# Altium integrated library BS_Altium_Lib.IntLib: 1016 symbols (part 1 of 8) (continued)
## DFLR1600-7 (continued)
DIODE GEN 600V 1A POWERDI123; Manufacturer: Diodes Incorporated; Diode Type: Standard; Voltage - Forward (Vf) (Max) @ If: 1.1V @ 1A; Speed: Standard Recovery >500ns, > 200mA (Io); Current - Reverse Leakage @ Vr: 3µA @ 600V; Capacitance @ Vr, F: 10pF @ 4V, 1MHz; Configuration: Single; Type: Standard Recovery Rectifiers; Max Surge Current: 25 A; Ir - Reverse Current: 3 uA; Vf - Forward Voltage: 1.1 V; Supplier 1: Digi-Key; Manufacturer Part Number: DFLR1600-7; RoHS: RoHS Compliant; Category: Discrete Semiconductor Products; Stock 1: 5690; Pricing 1: 1=0.46, 10=0.346, 100=0.2153, 500=0.1473, 1000=0.1133 (USD); Packaging: Cut Tape (CT); Part Status: Active; Voltage - DC Reverse (Vr) (Max): 600V; Current - Average Rectified (Io): 1A; Reverse Recovery Time (trr): -; Mounting Type: Surface Mount; Package / Case: POWERDI®123; Supplier Device Package: PowerDI™ 123; Operating Temperature - Junction: -65°C ~ 150°C; ComponentLink1URL: http://www.diodes.com/_files/datasheets/ds30602.pdf; ComponentLink1Description: http://www.diodes.com/_files/datasheets/ds30602.pdf; Supplier 2: Mouser; Stock 2: 4390; Pricing 2: 1=0.440, 10=0.312, 100=0.143, 1000=0.110, 3000=0.094, 9000=0.085, 24000=0.079, 45000=0.071, 99000=0.067 (USD); Height: 0.98 mm; Length: 2.8 mm; Operating Temperature Range: - 65 C to + 150 C; Product: Rectifiers; Series: DFLR1600; Width: 1.78 mm; Brand: Diodes Incorporated; Mounting Style: SMD/SMT; Recovery Time: -; If - Forward Current: 1 A; Maximum Operating Temperature: + 150 C; Minimum Operating Temperature: - 65 C; Pd - Power Dissipation: -; Standard Pack Qty: 3000; Vr - Reverse Voltage: 600 V; RoHS - Mouser: Y; Minimum Order Quantity: 1; Reeling: True; ComponentLink2URL: http://www.mouser.com/ds/2/115/ds30602-89344.pdf; ComponentLink2Description: http://www.mouser.com/ds/2/115/ds30602-89344.pdf; Supplier Part Number 1: DFLR1600-7DICT-ND; Supplier Part Number 2: 621-DFLR1600-7
footprint SOD PowerDI123
pins: 1 A, 2 K


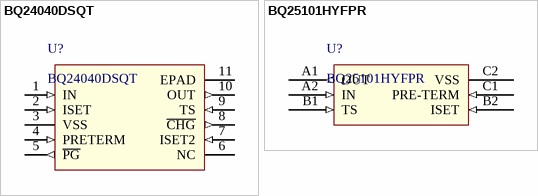
[diagram p7: symbols BQ24040DSQT to BQ25101HYFPR]

## BQ24040DSQT
designator U?
IC BATT CHG LI-ION 1 CELL 10SON; Manufacturer: Texas Instruments; Battery Chemistry: Lithium-Ion/Polymer; Number of Cells: 1; Current - Charging: Constant - Programmable; Programmable Features: Current; Fault Protection: Over Temperature, Over Voltage, Short Circuit; Charge Current - Max: 1A; Battery Pack Voltage: 4.2V; Voltage - Supply (Max): 28V; Supplier 1: Digi-Key; Supplier Part Number 1: 296-25136-1-ND; Manufacturer Part Number: BQ24040DSQT; RoHS: RoHS Compliant; Category: Integrated Circuits (ICs); Stock 1: 2838; Pricing 1: 1=1.48, 10=1.322, 100=1.0305 (USD); Packaging: Cut Tape (CT); Part Status: Active; Interface: -; Operating Temperature: -40°C ~ 85°C (TA); Supplier Device Package: 10-SON (2x2); ComponentLink1URL: http://www.ti.com/lit/ds/symlink/bq24040.pdf; ComponentLink1Description: http://www.ti.com/lit/ds/symlink/bq24040.pdf; Package: 10-WFDFN Exposed Pad
footprint WFDFN-10 Exposed Pad
pins: 1 IN (in), 2 ISET (in), 3 VSS (power), 4 PRETERM (in), 5 ~{PG} (out), 6 NC, 7 ISET2 (in), 8 ~{CHG} (out), 9 TS (in), 10 OUT (out), 11 EPAD (power)

## BQ25101HYFPR
designator U?
IC LI-ION CHARGE MGMT; Manufacturer: Texas Instruments; Battery Chemistry: Lithium-Ion/Polymer; Number of Cells: 1; Current - Charging: Constant - Programmable; Programmable Features: Current; Fault Protection: Over Temperature, Over Voltage, Short Circuit; Charge Current - Max: 250mA; Battery Pack Voltage: 4.35V; Voltage - Supply (Max): 6.45V; Supplier 1: Digi-Key; Supplier Part Number 1: 296-39932-1-ND; Manufacturer Part Number: BQ25101HYFPR; RoHS: RoHS Compliant; Category: Integrated Circuits (ICs); Stock 1: 6025; Pricing 1: 1=2.05, 10=1.842, 100=1.4809, 500=1.21668, 1000=1.00811 (USD); Packaging: Cut Tape (CT); Part Status: Active; Interface: -; Operating Temperature: 0°C ~ 125°C (TJ); Supplier Device Package: 6-DSBGA; ComponentLink1URL: http://www.ti.com/lit/ds/symlink/bq25101h.pdf; ComponentLink1Description: http://www.ti.com/lit/ds/symlink/bq25101h.pdf; Package: 6-XFBGA, DSBGA
footprint YFP6
pins: A1 OUT (out), A2 IN (in), B1 TS (in), B2 ISET (in), C1 PRE-TERM (in), C2 VSS (power)


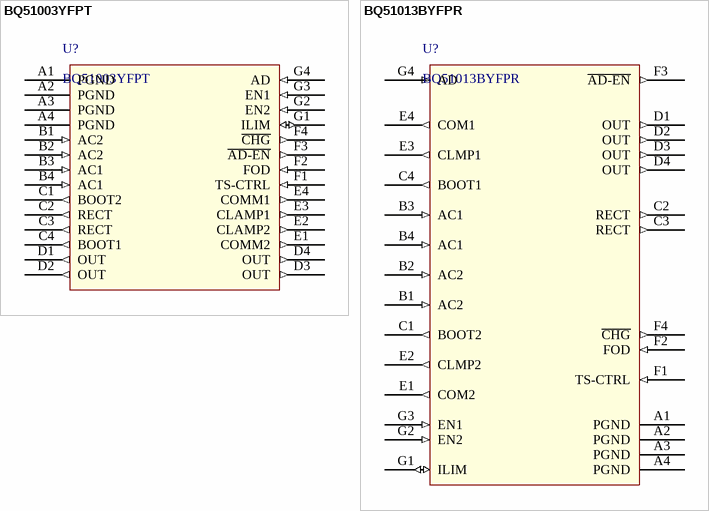
[diagram p8: symbols BQ51003YFPT to BQ51013BYFPR]

## BQ51003YFPT
designator U?
IC WIRELESS PWR RCVR 28DSBGA; Manufacturer: Texas Instruments; Current - Supply: 500mA; Voltage - Supply: 4 V ~ 10 V; Supplier 1: Digi-Key; Supplier Part Number 1: 296-37245-1-ND; Manufacturer Part Number: BQ51003YFPT; RoHS: RoHS Compliant; Category: Integrated Circuits (ICs); Stock 1: 1012; Pricing 1: 1=3.35, 10=2.99, 25=2.6908, 100=2.4517 (USD); Packaging: Cut Tape (CT); Part Status: Active; Applications: Wireless Power Receiver; Operating Temperature: -40°C ~ 85°C; Mounting Type: Surface Mount; Supplier Device Package: 28-DSBGA; ComponentLink1URL: http://www.ti.com/lit/ds/symlink/bq51003.pdf; ComponentLink1Description: http://www.ti.com/lit/ds/symlink/bq51003.pdf; Package: 28-XFBGA, DSBGA
footprint YFP28
pins: A1 PGND (power), A2 PGND (power), A3 PGND (power), A4 PGND (power), B1 AC2 (in), B2 AC2 (in), B3 AC1 (in), B4 AC1 (in), C1 BOOT2 (out), C2 RECT (out), C3 RECT (out), C4 BOOT1 (out), D1 OUT (out), D2 OUT (out), D3 OUT (out), D4 OUT (out), E1 COMM2 (out), E2 CLAMP2 (out), E3 CLAMP1 (out), E4 COMM1 (out), F1 TS-CTRL (in), F2 FOD (in), F3 ~{AD-EN} (out), F4 ~{CHG} (out), G1 ILIM (io), G2 EN2 (in), G3 EN1 (in), G4 AD (in)

## BQ51013BYFPR
designator U?
IC WIRELESS PWR RCVR 28DSBGA; Manufacturer: Texas Instruments; Current - Supply: 8mA; Voltage - Supply: 4 V ~ 10 V; Supplier 1: Digi-Key; Supplier Part Number 1: 296-39955-1-ND; Manufacturer Part Number: BQ51013BYFPR; RoHS: RoHS Compliant; Category: Integrated Circuits (ICs); Stock 1: 3099; Pricing 1: 1=3.32, 10=2.978, 100=2.4403, 500=2.0774, 1000=1.75203 (USD); Packaging: Cut Tape (CT); Part Status: Active; Applications: Wireless Power Receiver; Operating Temperature: 0°C ~ 125°C; Mounting Type: Surface Mount; Supplier Device Package: 28-DSBGA; ComponentLink1URL: http://www.ti.com/lit/ds/symlink/bq51013b.pdf; ComponentLink1Description: http://www.ti.com/lit/ds/symlink/bq51013b.pdf; Package: 28-XFBGA, DSBGA
footprint YFP28
pins: A1 PGND (power), A2 PGND (power), A3 PGND (power), A4 PGND (power), B1 AC2 (in), B2 AC2 (in), B3 AC1 (in), B4 AC1 (in), C1 BOOT2 (out), C2 RECT (out), C3 RECT (out), C4 BOOT1 (out), D1 OUT (out), D2 OUT (out), D3 OUT (out), D4 OUT (out), E1 COM2 (out), E2 CLMP2 (out), E3 CLMP1 (out), E4 COM1 (out), F1 TS-CTRL (in), F2 FOD (in), F3 ~{AD-EN} (out), F4 ~{CHG} (out), G1 ILIM (io), G2 EN2 (in), G3 EN1 (in), G4 AD (in)


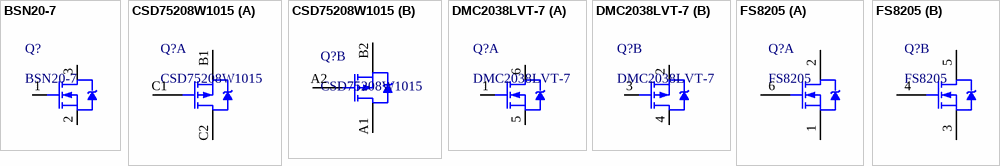
[diagram p9: symbols BSN20-7 to FS8205]

## BSN20-7
designator Q?
MOSFET N-CH 50V 500MA SOT23; Manufacturer: Diodes Incorporated; FET Type: N-Channel; Current - Continuous Drain (Id) @ 25°C: 500mA (Ta); Drive Voltage (Max Rds On,  Min Rds On): 4.5V, 10V; Vgs(th) (Max) @ Id: 1.5V @ 250µA; Gate Charge (Qg) (Max) @ Vgs: 0.8nC @ 10V; Input Capacitance (Ciss) (Max) @ Vds: 40pF @ 10V; Vgs (Max): ±20V; Power Dissipation (Max): 600mW (Ta); Rds On (Max) @ Id, Vgs: 1.8 Ohm @ 220mA, 10V; Supplier 1: Digi-Key; Supplier Part Number 1: BSN20-7DICT-ND; Manufacturer Part Number: BSN20-7; RoHS: RoHS Compliant; Category: Discrete Semiconductor Products; Stock 1: 30673; Pricing 1: 1=0.37, 10=0.306, 100=0.1621, 500=0.10666, 1000=0.07253 (USD); Packaging: Cut Tape (CT); Part Status: Active; Technology: MOSFET (Metal Oxide); Drain to Source Voltage (Vdss): 50V; FET Feature: -; Operating Temperature: -55°C ~ 150°C (TJ); Mounting Type: Surface Mount; Supplier Device Package: SOT-23; ComponentLink1URL: http://www.diodes.com/assets/Datasheets/ds31898.pdf; ComponentLink1Description: http://www.diodes.com/assets/Datasheets/ds31898.pdf; Package: TO-236-3, SC-59, SOT-23-3
footprint SOT-23 (SOT23, 3-Leads, Body 3.0x2.5mm (max), Pitch 0.95mm, IPC Medium Density)
pins: 1 G, 2 S, 3 D

## CSD75208W1015
designator Q?
MOSFET 2P-CH 20V 1.6A 6WLP; Manufacturer: Texas Instruments; FET Type: 2 P-Channel (Dual) Common Source; FET Feature: Logic Level Gate; Rds On (Max) @ Id, Vgs: 68 mOhm @ 1A, 4.5V; Vgs(th) (Max) @ Id: 1.1V @ 250µA; Gate Charge (Qg) (Max) @ Vgs: 2.5nC @ 4.5V; Input Capacitance (Ciss) (Max) @ Vds: 410pF @ 10V; Power - Max: 750mW; Supplier 1: Digi-Key; Supplier Part Number 1: 296-38339-1-ND; Manufacturer Part Number: CSD75208W1015; RoHS: RoHS Compliant; Category: Discrete Semiconductor Products; Stock 1: 9192; Pricing 1: 1=0.6, 10=0.51, 100=0.3807, 500=0.29912, 1000=0.23113 (USD); Packaging: Cut Tape (CT); Part Status: Active; Drain to Source Voltage (Vdss): 20V; Current - Continuous Drain (Id) @ 25°C: 1.6A; Operating Temperature: -55°C ~ 150°C (TJ); Mounting Type: Surface Mount; Supplier Device Package: 6-DSBGA; ComponentLink1URL: http://www.ti.com/lit/ds/symlink/csd75208w1015.pdf; ComponentLink1Description: http://www.ti.com/lit/ds/symlink/csd75208w1015.pdf; Package: 6-UFBGA, DSBGA
footprint DSBGA6 (1015)
part A pins: B1 S "Source", C1 G1 "Gate1", C2 D1 "Drain1"
part B pins: A1 D2 "Drain2", A2 G2 "Gate2", B2 S "Source"

## DMC2038LVT-7
designator Q?
MOSFET N/P-CH 20V TSOT26; Manufacturer: Diodes Incorporated; FET Type: N and P-Channel; FET Feature: Logic Level Gate; Current - Continuous Drain (Id) @ 25°C: 3.7A, 2.6A; Rds On (Max) @ Id, Vgs: 35 mOhm @ 4A, 4.5V; Vgs(th) (Max) @ Id: 1V @ 250µA; Gate Charge (Qg) (Max) @ Vgs: 17nC @ 10V; Input Capacitance (Ciss) (Max) @ Vds: 530pF @ 10V; Power - Max: 800mW; Supplier 1: Digi-Key; Manufacturer Part Number: DMC2038LVT-7; RoHS: RoHS Compliant; Category: Discrete Semiconductor Products; Stock 1: 58462; Pricing 1: 1=0.39, 10=0.29, 100=0.1808, 500=0.12372, 1000=0.09517 (USD); Packaging: Cut Tape (CT); Part Status: Active; Drain to Source Voltage (Vdss): 20V; Operating Temperature: -55°C ~ 150°C (TJ); Mounting Type: Surface Mount; Package / Case: SOT-23-6 Thin, TSOT-23-6; Supplier Device Package: TSOT-26; ComponentLink1URL: http://www.diodes.com/assets/Datasheets/DMC2038LVT.pdf; ComponentLink1Description: http://www.diodes.com/assets/Datasheets/DMC2038LVT.pdf; Supplier Part Number 1: DMC2038LVT-7DICT-ND
footprint SOT-23-6 Thin (TSOT-26)
part A pins: 1 G, 5 S, 6 D
part B pins: 2 S, 3 G, 4 D

## FS8205
designator Q?
MOSFET 2N-CH 20V 4.0A SOT23-6; Manufacturer: Fortune; FET Type: 2 N-Channel (Dual) Common Drain; FET Feature: Logic Level Gate; Manufacturer Part Number: FS8205; Category: Discrete Semiconductor Products; Drain to Source Voltage (Vdss): 20V; Current - Continuous Drain (Id) @ 25°C: 4.0A; Mounting Type: Surface Mount; Supplier Device Package: SOT23-6; ComponentLink1URL: http://www.sz-hxdz.com/uploadfile/pdf/201505181114403630.pdf; ComponentLink1Description: http://www.sz-hxdz.com/uploadfile/pdf/201505181114403630.pdf; Package: SOT23-6
footprint SOT-23-6 (SOT23, 6-Leads, Body 3.0x3.0mm (max), Pitch 0.95mm, IPC Medium Density)
part A pins: 1 S1, 2 D, 6 G1
part B pins: 3 S2, 4 G2, 5 D


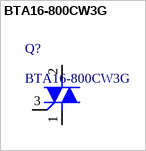
[diagram p10: symbol BTA16-800CW3G]

## BTA16-800CW3G
designator Q?
TRIAC 800V 16A TO220AB; Manufacturer: ON Semiconductor; Triac Type: Standard; Voltage - Gate Trigger (Vgt) (Max): 1.1V; Current - Non Rep. Surge 50, 60Hz (Itsm): 170A @ 60Hz; Current - Gate Trigger (Igt) (Max): 35mA; Current - Hold (Ih) (Max): 50mA; Configuration: Single; Supplier 1: Digi-Key; Supplier Part Number 1: BTA16-800CW3GOS-ND; Manufacturer Part Number: BTA16-800CW3G; RoHS: RoHS Compliant; Category: Discrete Semiconductor Products; Stock 1: 961; Pricing 1: 1=1.37, 10=1.221, 100=0.9522, 500=0.7866, 1000=0.621 (USD); Packaging: Tube; Part Status: Active; Voltage - Off State: 800V; Current - On State (It (RMS)) (Max): 16A; Operating Temperature: -40°C ~ 125°C (TJ); Mounting Type: Through Hole; Package / Case: TO-220-3; Supplier Device Package: TO-220AB; ComponentLink1URL: http://media.digikey.com/pdf/Data%20Sheets/ON%20Semiconductor%20PDFs/BTA16-600_800CW3G.pdf; ComponentLink1Description: http://media.digikey.com/pdf/Data%20Sheets/ON%20Semiconductor%20PDFs/BTA16-600_800CW3G.pdf; Supplier 2: Mouser; Supplier Part Number 2: 863-BTA16-800CW3G
footprint TO-220AB
footprint TO-220AB flat
pins: 1 T1, 2 T2, 3 G


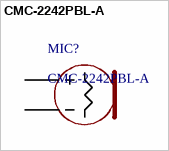
[diagram p11: symbol CMC-2242PBL-A]

## CMC-2242PBL-A
designator MIC?
MIC COND ANALOG OMNI -42DB; Manufacturer: CUI Inc.; Direction: Omnidirectional; Frequency Range: 100Hz ~ 20kHz; Sensitivity: -42dB ±3dB @ 94dB SPL; S/N Ratio: 58dB; Impedance: 2.2 kOhm; Voltage - Rated: 2V; Voltage Range: 2 ~ 10V; Current - Supply: 500µA; Port Location: Top; Seal Rating: None; Shape: Circular; Supplier 1: Digi-Key; Supplier Part Number 1: 102-1727-ND; Manufacturer Part Number: CMC-2242PBL-A; RoHS: RoHS Compliant; Category: Audio Products; Stock 1: 12966; Pricing 1: 1=2.1, 10=1.833, 25=1.426, 50=1.2902, 100=1.1543, 250=1.12036, 500=1.0864, 1000=0.98455, 5000=0.8827 (USD); Packaging: Bulk; Part Status: Active; Type: Electret Condenser; Output Type: Analog; Termination: PC Pins; Size / Dimension: 0.236" Dia (6.00mm); Height (Max): 0.094" (2.40mm); ComponentLink1URL: http://www.cui.com/product/resource/digikeypdf/cmc-2242pbl-a.pdf; ComponentLink1Description: http://www.cui.com/product/resource/digikeypdf/cmc-2242pbl-a.pdf
footprint MIC Dia 6.00mm
pins: 1 +, 2 -


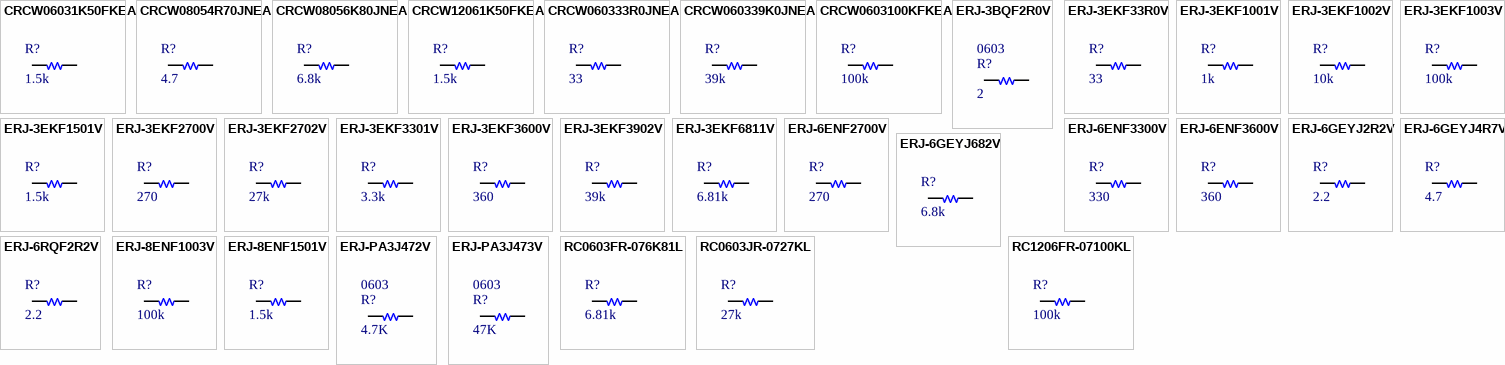
[diagram p12: symbols CRCW06031K50FKEA to RC1206FR-07100KL]

## CRCW06031K50FKEA
designator R?, comment 1.5k
RES SMD 1.5K OHM 1% 1/10W 0603; Manufacturer: Vishay Dale; Manufacturer Part Number: CRCW06031K50FKEA; Power (Watts): 0.1W, 1/10W; Temperature Coefficient: ±100ppm/°C; Power Rating: 100 mW; Voltage Rating: 75 V; Brand: Vishay / Dale; Supplier 1: Digi-Key; RoHS: RoHS Compliant; Category: Resistors; Stock 1: 135073; Pricing 1: 1=0.1, 10=0.03, 25=0.022, 50=0.0168, 100=0.0123, 250=0.0094, 500=0.00752, 1000=0.00554, 2500=0.00481 (USD); Packaging: Cut Tape (CT); Part Status: Active; Tolerance: ±1%; Composition: Thick Film; Features: Automotive AEC-Q200; Operating Temperature: -55°C ~ 155°C; Package: 0603 (1608 Metric); Supplier Device Package: 0603; Size / Dimension: 0.063" L x 0.033" W (1.60mm x 0.85mm); Height - Seated (Max): 0.020" (0.50mm); Number of Terminations: 2; Failure Rate: -; ComponentLink1URL: http://www.vishay.com/docs/20035/dcrcwe3.pdf; ComponentLink1Description: http://www.vishay.com/docs/20035/dcrcwe3.pdf; Supplier 2: Mouser; Stock 2: 209952; Pricing 2: 1=0.100, 10=0.044, 100=0.026, 500=0.021, 1000=0.018, 5000=0.006, 25000=0.005, 50000=0.004 (USD); Height: 0.45 mm; Length: 1.55 mm; Operating Temperature Range: - 55 C to + 155 C; Product: Thick Film Resistors SMD; Resistance: 1.5k; Series: CRCW; Termination Style: SMD/SMT; Width: 0.85 mm; Case Code - in: 0603; Case Code - mm: 1608; Standard Pack Qty: 5000; RoHS - Mouser: E; Minimum Order Quantity: 1; Reeling: True; ComponentLink2URL: http://www.mouser.com/ds/2/427/dcrcwe3-109170.pdf; ComponentLink2Description: http://www.mouser.com/ds/2/427/dcrcwe3-109170.pdf; Supplier Part Number 1: 541-1.50KHCT-ND; Supplier Part Number 2: 71-CRCW0603-1.5K-E3
footprint R 0603 (Chip Resistor, 2-Leads, Body 1.6x0.8mm, IPC Medium Density)
pins: 1, 2

## CRCW08054R70JNEA
designator R?, comment 4.7
RES SMD 4.7 OHM 5% 1/8W 0805; Manufacturer: Vishay Dale; Manufacturer Part Number: CRCW08054R70JNEA; Power (Watts): 0.125W, 1/8W; Temperature Coefficient: ±200ppm/°C; Power Rating: 125 mW (1/8 W); Voltage Rating: 150 V; Brand: Vishay / Dale; Supplier 1: Digi-Key; RoHS: RoHS Compliant; Category: Resistors; Stock 1: 35799; Pricing 1: 1=0.1, 10=0.026, 25=0.0184, 50=0.014, 100=0.0104, 250=0.00792, 500=0.00634, 1000=0.00466, 2500=0.00405 (USD); Packaging: Cut Tape (CT); Part Status: Active; Tolerance: ±5%; Composition: Thick Film; Features: Automotive AEC-Q200; Operating Temperature: -55°C ~ 155°C; Package: 0805 (2012 Metric); Supplier Device Package: 0805; Size / Dimension: 0.079" L x 0.049" W (2.00mm x 1.25mm); Height - Seated (Max): 0.020" (0.50mm); Number of Terminations: 2; Failure Rate: -; ComponentLink1URL: http://www.vishay.com/docs/20035/dcrcwe3.pdf; ComponentLink1Description: http://www.vishay.com/docs/20035/dcrcwe3.pdf; Supplier 2: Mouser; Stock 2: 20019; Pricing 2: 1=0.100, 10=0.042, 100=0.024, 500=0.023, 1000=0.017, 5000=0.005, 25000=0.004 (USD); Height: 0.45 mm; Length: 2 mm; Operating Temperature Range: - 55 C to + 155 C; Product: Thick Film Resistors SMD; Resistance: 4.7; Termination Style: SMD/SMT; Width: 1.25 mm; Case Code - in: 0805; Case Code - mm: 2012; Standard Pack Qty: 5000; RoHS - Mouser: E; Minimum Order Quantity: 1; Reeling: True; ComponentLink2URL: http://www.mouser.com/ds/2/427/dcrcwe3-109170.pdf; ComponentLink2Description: http://www.mouser.com/ds/2/427/dcrcwe3-109170.pdf; Supplier Part Number 1: 541-4.7ACT-ND; Supplier Part Number 2: 71-CRCW08054R70JNEA
footprint R 0805 (Chip Resistor, 2-Leads, Body 2.0x1.3mm, IPC Medium Density)
pins: 1, 2

## CRCW08056K80JNEA
designator R?, comment 6.8k
RES SMD 6.8K OHM 5% 1/8W 0805; Manufacturer: Vishay Dale; Manufacturer Part Number: CRCW08056K80JNEA; Power (Watts): 0.125W, 1/8W; Temperature Coefficient: ±200ppm/°C; Power Rating: 125 mW (1/8 W); Voltage Rating: 150 V; Brand: Vishay / Dale; Supplier 1: Digi-Key; RoHS: RoHS Compliant; Category: Resistors; Stock 1: 41524; Pricing 1: 1=0.1, 10=0.026, 25=0.0184, 50=0.014, 100=0.0104, 250=0.00792, 500=0.00634, 1000=0.00466, 2500=0.00405 (USD); Packaging: Cut Tape (CT); Part Status: Active; Tolerance: ±5%; Composition: Thick Film; Features: Automotive AEC-Q200; Operating Temperature: -55°C ~ 155°C; Package: 0805 (2012 Metric); Supplier Device Package: 0805; Size / Dimension: 0.079" L x 0.049" W (2.00mm x 1.25mm); Height - Seated (Max): 0.020" (0.50mm); Number of Terminations: 2; Failure Rate: -; ComponentLink1URL: http://www.vishay.com/docs/20035/dcrcwe3.pdf; ComponentLink1Description: http://www.vishay.com/docs/20035/dcrcwe3.pdf; Supplier 2: Mouser; Stock 2: 12423; Pricing 2: 1=0.100, 10=0.042, 100=0.024, 500=0.023, 1000=0.017, 5000=0.005, 25000=0.004 (USD); Height: 0.45 mm; Length: 2 mm; Operating Temperature Range: - 55 C to + 155 C; Product: Thick Film Resistors SMD; Resistance: 6.8k; Series: CRCW; Termination Style: SMD/SMT; Width: 1.25 mm; Case Code - in: 0805; Case Code - mm: 2012; Standard Pack Qty: 5000; RoHS - Mouser: E; Minimum Order Quantity: 1; Reeling: True; ComponentLink2URL: http://www.mouser.com/ds/2/427/dcrcwe3-109170.pdf; ComponentLink2Description: http://www.mouser.com/ds/2/427/dcrcwe3-109170.pdf; Supplier Part Number 1: 541-6.8KACT-ND; Supplier Part Number 2: 71-CRCW08056K80JNEA
footprint R 0805 (Chip Resistor, 2-Leads, Body 2.0x1.3mm, IPC Medium Density)
pins: 1, 2

## CRCW12061K50FKEA
designator R?, comment 1.5k
RES SMD 1.5K OHM 1% 1/4W 1206; Manufacturer: Vishay Dale; Manufacturer Part Number: CRCW12061K50FKEA; Power (Watts): 0.25W, 1/4W; Temperature Coefficient: ±100ppm/°C; Power Rating: 250 mW (1/4 W); Voltage Rating: 200 V; Brand: Vishay / Dale; Supplier 1: Digi-Key; RoHS: RoHS Compliant; Category: Resistors; Stock 1: 122395; Pricing 1: 1=0.1, 10=0.054, 25=0.0392, 50=0.03, 100=0.0221, 250=0.01684, 500=0.01346, 1000=0.00991, 2500=0.0086 (USD); Packaging: Cut Tape (CT); Part Status: Active; Tolerance: ±1%; Composition: Thick Film; Features: Automotive AEC-Q200; Operating Temperature: -55°C ~ 155°C; Package: 1206 (3216 Metric); Supplier Device Package: 1206; Size / Dimension: 0.126" L x 0.063" W (3.20mm x 1.60mm); Height - Seated (Max): 0.024" (0.60mm); Number of Terminations: 2; Failure Rate: -; ComponentLink1URL: http://www.vishay.com/docs/20035/dcrcwe3.pdf; ComponentLink1Description: http://www.vishay.com/docs/20035/dcrcwe3.pdf; Supplier 2: Mouser; Stock 2: 19350; Pricing 2: 1=0.100, 10=0.055, 100=0.032, 1000=0.022, 5000=0.011, 10000=0.010, 25000=0.009, 50000=0.007, 100000=0.006 (USD); Height: 0.55 mm; Length: 3.2 mm; Operating Temperature Range: - 55 C to + 155 C; Product: Thick Film Resistors SMD; Resistance: 1.5k; Termination Style: SMD/SMT; Width: 1.6 mm; Case Code - in: 1206; Case Code - mm: 3216; Standard Pack Qty: 5000; RoHS - Mouser: E; Minimum Order Quantity: 1; Reeling: True; ComponentLink2URL: http://www.mouser.com/ds/2/427/dcrcwe3-109170.pdf; ComponentLink2Description: http://www.mouser.com/ds/2/427/dcrcwe3-109170.pdf; Supplier Part Number 1: 541-1.50KFCT-ND; Supplier Part Number 2: 71-CRCW1206-1.5K-E3
footprint R 1206 (Chip Resistor, 2-Leads, Body 3.1x1.6mm, IPC Medium Density)
pins: 1, 2

## CRCW060333R0JNEA
designator R?, comment 33
RES SMD 33 OHM 5% 1/10W 0603; Manufacturer: Vishay Dale; Manufacturer Part Number: CRCW060333R0JNEA; Power (Watts): 0.1W, 1/10W; Temperature Coefficient: ±200ppm/°C; Power Rating: 100 mW; Voltage Rating: 75 V; Brand: Vishay / Dale; Qualification: Commercial; Supplier 1: Digi-Key; RoHS: RoHS Compliant; Category: Resistors; Stock 1: 75628; Pricing 1: 1=0.1, 10=0.022, 25=0.016, 50=0.0124, 100=0.0091, 250=0.00692, 500=0.00554, 1000=0.00408, 2500=0.00354 (USD); Packaging: Cut Tape (CT); Part Status: Active; Tolerance: ±5%; Composition: Thick Film; Features: Automotive AEC-Q200; Operating Temperature: -55°C ~ 155°C; Package: 0603 (1608 Metric); Supplier Device Package: 0603; Size / Dimension: 0.063" L x 0.033" W (1.60mm x 0.85mm); Height - Seated (Max): 0.020" (0.50mm); Number of Terminations: 2; Failure Rate: -; ComponentLink1URL: http://www.vishay.com/docs/20035/dcrcwe3.pdf; ComponentLink1Description: http://www.vishay.com/docs/20035/dcrcwe3.pdf; Supplier 2: Mouser; Stock 2: 58097; Pricing 2: 1=0.100, 10=0.010, 100=0.008, 10000=0.003, 30000=0.002 (USD); Height: 0.45 mm; Length: 1.55 mm; Operating Temperature Range: - 55 C to + 155 C; Product: Thick Film Resistors SMD; Resistance: 33; Series: CRCW; Termination Style: SMD/SMT; Width: 0.85 mm; Case Code - in: 0603; Case Code - mm: 1608; Standard Pack Qty: 10000; RoHS - Mouser: E; Minimum Order Quantity: 1; Reeling: True; ComponentLink2URL: http://www.mouser.com/ds/2/427/dcrcwe3-109170.pdf; ComponentLink2Description: http://www.mouser.com/ds/2/427/dcrcwe3-109170.pdf; Supplier Part Number 1: 541-33GCT-ND; Supplier Part Number 2: 71-CRCW060333R0JNEB
footprint R 0603 (Chip Resistor, 2-Leads, Body 1.6x0.8mm, IPC Medium Density)
pins: 1, 2

## CRCW060339K0JNEA
designator R?, comment 39k
RES SMD 39K OHM 5% 1/10W 0603; Manufacturer: Vishay Dale; Manufacturer Part Number: CRCW060339K0JNEA; Power (Watts): 0.1W, 1/10W; Temperature Coefficient: ±200ppm/°C; Power Rating: 100 mW; Voltage Rating: 75 V; Brand: Vishay / Dale; Supplier 1: Digi-Key; RoHS: RoHS Compliant; Category: Resistors; Stock 1: 24961; Pricing 1: 1=0.1, 10=0.022, 25=0.016, 50=0.0124, 100=0.0091, 250=0.00692, 500=0.00554, 1000=0.00408, 2500=0.00354 (USD); Packaging: Cut Tape (CT); Part Status: Active; Tolerance: ±5%; Composition: Thick Film; Features: Automotive AEC-Q200; Operating Temperature: -55°C ~ 155°C; Package: 0603 (1608 Metric); Supplier Device Package: 0603; Size / Dimension: 0.063" L x 0.033" W (1.60mm x 0.85mm); Height - Seated (Max): 0.020" (0.50mm); Number of Terminations: 2; Failure Rate: -; ComponentLink1URL: http://www.vishay.com/docs/20035/dcrcwe3.pdf; ComponentLink1Description: http://www.vishay.com/docs/20035/dcrcwe3.pdf; Supplier 2: Mouser; Stock 2: 14890; Pricing 2: 1=0.100, 10=0.040, 100=0.023, 500=0.019, 1000=0.016, 5000=0.005, 10000=0.004, 50000=0.003 (USD); Height: 0.45 mm; Length: 1.55 mm; Operating Temperature Range: - 55 C to + 155 C; Product: Thick Film Resistors SMD; Resistance: 39k; Series: CRCW; Termination Style: SMD/SMT; Width: 0.85 mm; Case Code - in: 0603; Case Code - mm: 1608; Standard Pack Qty: 5000; RoHS - Mouser: E; Minimum Order Quantity: 1; Reeling: True; ComponentLink2URL: http://www.mouser.com/ds/2/427/dcrcwe3-109170.pdf; ComponentLink2Description: http://www.mouser.com/ds/2/427/dcrcwe3-109170.pdf; Supplier Part Number 1: 541-39KGCT-ND; Supplier Part Number 2: 71-CRCW0603J-39K-E3
footprint R 0603 (Chip Resistor, 2-Leads, Body 1.6x0.8mm, IPC Medium Density)
pins: 1, 2

## CRCW0603100KFKEA
designator R?, comment 100k
RES SMD 100K OHM 1% 1/10W 0603; Manufacturer: Vishay Dale; Manufacturer Part Number: CRCW0603100KFKEA; Power (Watts): 0.1W, 1/10W; Temperature Coefficient: ±100ppm/°C; Power Rating: 100 mW; Voltage Rating: 75 V; Brand: Vishay / Dale; Supplier 1: Digi-Key; RoHS: RoHS Compliant; Category: Resistors; Stock 1: 560132; Pricing 1: 1=0.1, 10=0.03, 25=0.022, 50=0.0168, 100=0.0123, 250=0.0094, 500=0.00752, 1000=0.00554, 2500=0.00481 (USD); Packaging: Cut Tape (CT); Part Status: Active; Tolerance: ±1%; Composition: Thick Film; Features: Automotive AEC-Q200; Operating Temperature: -55°C ~ 155°C; Package: 0603 (1608 Metric); Supplier Device Package: 0603; Size / Dimension: 0.063" L x 0.033" W (1.60mm x 0.85mm); Height - Seated (Max): 0.020" (0.50mm); Number of Terminations: 2; Failure Rate: -; ComponentLink1URL: http://www.vishay.com/docs/20035/dcrcwe3.pdf; ComponentLink1Description: http://www.vishay.com/docs/20035/dcrcwe3.pdf; Supplier 2: Mouser; Stock 2: 655655; Pricing 2: 1=0.100, 10=0.044, 100=0.026, 500=0.021, 1000=0.018, 5000=0.006, 25000=0.005, 50000=0.004 (USD); Height: 0.45 mm; Length: 1.55 mm; Operating Temperature Range: - 55 C to + 155 C; Product: Thick Film Resistors SMD; Resistance: 100k; Termination Style: SMD/SMT; Width: 0.85 mm; Case Code - in: 0603; Case Code - mm: 1608; Standard Pack Qty: 5000; RoHS - Mouser: E; Minimum Order Quantity: 1; Reeling: True; ComponentLink2URL: http://www.mouser.com/ds/2/427/dcrcwe3-109170.pdf; ComponentLink2Description: http://www.mouser.com/ds/2/427/dcrcwe3-109170.pdf; Supplier Part Number 1: 541-100KHCT-ND; Supplier Part Number 2: 71-CRCW0603-100K-E3
footprint R 0603 (Chip Resistor, 2-Leads, Body 1.6x0.8mm, IPC Medium Density)
pins: 1, 2

## ERJ-3BQF2R0V
designator R?, comment 2  Package: 0603
RES SMD 2 OHM 1% 1/4W 0603; Manufacturer: Panasonic Electronic Components; Manufacturer Part Number: ERJ-3BQF2R0V; Power (Watts): 0.25W, 1/4W; Temperature Coefficient: ±200ppm/°C; Supplier 1: Digi-Key; Supplier Part Number 1: P17377CT-ND; RoHS: RoHS Compliant; Category: Resistors; Stock 1: 4438; Pricing 1: 1=0.35, 10=0.299, 25=0.2176, 50=0.1578, 100=0.117, 250=0.08976, 500=0.07072, 1000=0.04896 (USD); Packaging: Cut Tape (CT); Part Status: Active; Resistance: 2; Tolerance: ±1%; Composition: Thick Film; Features: Automotive AEC-Q200, Current Sense; Operating Temperature: -55°C ~ 125°C; Supplier Device Package: 0603; Size / Dimension: 0.063" L x 0.031" W (1.60mm x 0.80mm); Height - Seated (Max): 0.022" (0.55mm); Failure Rate: -; ComponentLink1URL: https://industrial.panasonic.com/cdbs/www-data/pdf/RDN0000/AOA0000C295.pdf; ComponentLink1Description: https://industrial.panasonic.com/cdbs/www-data/pdf/RDN0000/AOA0000C295.pdf
footprint R 0603 (Chip Resistor, 2-Leads, Body 1.6x0.8mm, IPC Medium Density)
pins: 1, 2

## ERJ-3EKF33R0V
designator R?, comment 33
RES SMD 33 OHM 1% 1/10W 0603; Manufacturer: Panasonic Electronic Components; Manufacturer Part Number: ERJ-3EKF33R0V; Power (Watts): 0.1W, 1/10W; Temperature Coefficient: ±100ppm/°C; Power Rating: 100 mW; Voltage Rating: 75 V; Brand: Panasonic; Qualification: AEC-Q200; Supplier 1: Digi-Key; Supplier Part Number 1: P33.0HCT-ND; RoHS: RoHS Compliant; Category: Resistors; Stock 1: 1440116; Pricing 1: 1=0.1, 50=0.0114, 100=0.0084, 250=0.00644, 500=0.00514, 1000=0.00379 (USD); Packaging: Cut Tape (CT); Part Status: Active; Tolerance: ±1%; Composition: Thick Film; Features: Automotive AEC-Q200; Operating Temperature: -55°C ~ 155°C; Package: 0603 (1608 Metric); Supplier Device Package: 0603; Size / Dimension: 0.063" L x 0.031" W (1.60mm x 0.80mm); Height - Seated (Max): 0.022" (0.55mm); Number of Terminations: 2; Failure Rate: -; ComponentLink1URL: http://industrial.panasonic.com/www-cgi/jvcr13pz.cgi?E+PZ+3+AOA0002+ERJ3EKF33R0V+7+WW; ComponentLink1Description: http://industrial.panasonic.com/www-cgi/jvcr13pz.cgi?E+PZ+3+AOA0002+ERJ3EKF33R0V+7+WW; Supplier 2: Mouser; Supplier Part Number 2: 667-ERJ-3EKF33R0V; Stock 2: 201960; Pricing 2: 1=0.150, 10=0.014, 100=0.006, 1000=0.004, 5000=0.002 (USD); Height: 0.45 mm; Length: 1.6 mm; Operating Temperature Range: - 55 C to + 155 C; Product: Thick Film Resistors SMD; Resistance: 33; Series: ERJ; Termination Style: SMD/SMT; Type: Precision Thick Film Resistors SMD; Width: 0.8 mm; Case Code - in: 0603; Case Code - mm: 1608; Standard Pack Qty: 5000; RoHS - Mouser: E; Minimum Order Quantity: 1; Reeling: True; ComponentLink2URL: http://www.mouser.com/ds/2/315/AOA0000C86-911473.pdf; ComponentLink2Description: http://www.mouser.com/ds/2/315/AOA0000C86-911473.pdf
footprint R 0603 (Chip Resistor, 2-Leads, Body 1.6x0.8mm, IPC Medium Density)
pins: 1, 2

## ERJ-3EKF1001V
designator R?, comment 1k
RES SMD 1K OHM 1% 1/10W 0603; Manufacturer: Panasonic Electronic Components; Manufacturer Part Number: ERJ-3EKF1001V; Power (Watts): 0.1W, 1/10W; Temperature Coefficient: ±100ppm/°C; Power Rating: 100 mW; Voltage Rating: 75 V; Brand: Panasonic; Qualification: AEC-Q200; Supplier 1: Digi-Key; Supplier Part Number 1: P1.00KHCT-ND; RoHS: RoHS Compliant; Category: Resistors; Stock 1: 1674787; Pricing 1: 1=0.1, 50=0.0114, 100=0.0084, 250=0.00644, 500=0.00514, 1000=0.00379 (USD); Packaging: Cut Tape (CT); Part Status: Active; Tolerance: ±1%; Composition: Thick Film; Features: Automotive AEC-Q200; Operating Temperature: -55°C ~ 155°C; Package: 0603 (1608 Metric); Supplier Device Package: 0603; Size / Dimension: 0.063" L x 0.031" W (1.60mm x 0.80mm); Height - Seated (Max): 0.022" (0.55mm); Number of Terminations: 2; Failure Rate: -; ComponentLink1URL: http://industrial.panasonic.com/www-cgi/jvcr13pz.cgi?E+PZ+3+AOA0002+ERJ3EKF1001V+7+WW; ComponentLink1Description: http://industrial.panasonic.com/www-cgi/jvcr13pz.cgi?E+PZ+3+AOA0002+ERJ3EKF1001V+7+WW; Supplier 2: Mouser; Supplier Part Number 2: 667-ERJ-3EKF1001V; Stock 2: 834903; Pricing 2: 1=0.150, 10=0.014, 100=0.006, 1000=0.004, 5000=0.002 (USD); Height: 0.45 mm; Length: 1.6 mm; Operating Temperature Range: - 55 C to + 155 C; Product: Thick Film Resistors SMD; Resistance: 1k; Series: ERJ; Termination Style: SMD/SMT; Type: Precision Thick Film Resistors SMD; Width: 0.8 mm; Case Code - in: 0603; Case Code - mm: 1608; Standard Pack Qty: 5000; RoHS - Mouser: E; Minimum Order Quantity: 1; Reeling: True; ComponentLink2URL: http://www.mouser.com/ds/2/315/AOA0000C86-911473.pdf; ComponentLink2Description: http://www.mouser.com/ds/2/315/AOA0000C86-911473.pdf
footprint R 0603 (Chip Resistor, 2-Leads, Body 1.6x0.8mm, IPC Medium Density)
pins: 1, 2

## ERJ-3EKF1002V
designator R?, comment 10k
RES SMD 10K OHM 1% 1/10W 0603; Manufacturer: Panasonic Electronic Components; Manufacturer Part Number: ERJ-3EKF1002V; Power (Watts): 0.1W, 1/10W; Temperature Coefficient: ±100ppm/°C; Power Rating: 100 mW; Voltage Rating: 75 V; Brand: Panasonic; Qualification: AEC-Q200; Supplier 1: Digi-Key; Supplier Part Number 1: P10.0KHCT-ND; RoHS: RoHS Compliant; Category: Resistors; Stock 1: 8933446; Pricing 1: 1=0.1, 50=0.0114, 100=0.0084, 250=0.00644, 500=0.00514, 1000=0.00379 (USD); Packaging: Cut Tape (CT); Part Status: Active; Tolerance: ±1%; Composition: Thick Film; Features: Automotive AEC-Q200; Operating Temperature: -55°C ~ 155°C; Package: 0603 (1608 Metric); Supplier Device Package: 0603; Size / Dimension: 0.063" L x 0.031" W (1.60mm x 0.80mm); Height - Seated (Max): 0.022" (0.55mm); Number of Terminations: 2; Failure Rate: -; ComponentLink1URL: http://industrial.panasonic.com/www-cgi/jvcr13pz.cgi?E+PZ+3+AOA0002+ERJ3EKF1002V+7+WW; ComponentLink1Description: http://industrial.panasonic.com/www-cgi/jvcr13pz.cgi?E+PZ+3+AOA0002+ERJ3EKF1002V+7+WW; Supplier 2: Mouser; Supplier Part Number 2: 667-ERJ-3EKF1002V; Stock 2: 321816; Pricing 2: 1=0.150, 10=0.014, 100=0.006, 1000=0.004, 5000=0.002 (USD); Height: 0.45 mm; Length: 1.6 mm; Operating Temperature Range: - 55 C to + 155 C; Product: Thick Film Resistors SMD; Resistance: 10k; Series: ERJ; Termination Style: SMD/SMT; Type: Precision Thick Film Resistors SMD; Width: 0.8 mm; Case Code - in: 0603; Case Code - mm: 1608; Standard Pack Qty: 5000; RoHS - Mouser: E; Minimum Order Quantity: 1; Reeling: True; ComponentLink2URL: http://www.mouser.com/ds/2/315/AOA0000C86-911473.pdf; ComponentLink2Description: http://www.mouser.com/ds/2/315/AOA0000C86-911473.pdf
footprint R 0603 (Chip Resistor, 2-Leads, Body 1.6x0.8mm, IPC Medium Density)
pins: 1, 2

## ERJ-3EKF1003V
designator R?, comment 100k
RES SMD 100K OHM 1% 1/10W 0603; Manufacturer: Panasonic Electronic Components; Manufacturer Part Number: ERJ-3EKF1003V; Power (Watts): 0.1W, 1/10W; Temperature Coefficient: ±100ppm/°C; Power Rating: 100 mW; Voltage Rating: 75 V; Brand: Panasonic; Qualification: AEC-Q200; Supplier 1: Digi-Key; Supplier Part Number 1: P100KHCT-ND; RoHS: RoHS Compliant; Category: Resistors; Stock 1: 2821634; Pricing 1: 1=0.1, 50=0.0114, 100=0.0084, 250=0.00644, 500=0.00514, 1000=0.00379 (USD); Packaging: Cut Tape (CT); Part Status: Active; Tolerance: ±1%; Composition: Thick Film; Features: Automotive AEC-Q200; Operating Temperature: -55°C ~ 155°C; Package: 0603 (1608 Metric); Supplier Device Package: 0603; Size / Dimension: 0.063" L x 0.031" W (1.60mm x 0.80mm); Height - Seated (Max): 0.022" (0.55mm); Number of Terminations: 2; Failure Rate: -; ComponentLink1URL: http://industrial.panasonic.com/www-cgi/jvcr13pz.cgi?E+PZ+3+AOA0002+ERJ3EKF1003V+7+WW; ComponentLink1Description: http://industrial.panasonic.com/www-cgi/jvcr13pz.cgi?E+PZ+3+AOA0002+ERJ3EKF1003V+7+WW; Supplier 2: Mouser; Supplier Part Number 2: 667-ERJ-3EKF1003V; Stock 2: 446181; Pricing 2: 1=0.150, 10=0.014, 100=0.006, 1000=0.004, 5000=0.002 (USD); Height: 0.45 mm; Length: 1.6 mm; Operating Temperature Range: - 55 C to + 155 C; Product: Thick Film Resistors SMD; Resistance: 100k; Series: ERJ; Termination Style: SMD/SMT; Type: Precision Thick Film Resistors SMD; Width: 0.8 mm; Case Code - in: 0603; Case Code - mm: 1608; Standard Pack Qty: 5000; RoHS - Mouser: E; Minimum Order Quantity: 1; Reeling: True; ComponentLink2URL: http://www.mouser.com/ds/2/315/AOA0000C86-911473.pdf; ComponentLink2Description: http://www.mouser.com/ds/2/315/AOA0000C86-911473.pdf
footprint R 0603 (Chip Resistor, 2-Leads, Body 1.6x0.8mm, IPC Medium Density)
pins: 1, 2

## ERJ-3EKF1501V
designator R?, comment 1.5k
RES SMD 1.5K OHM 1% 1/10W 0603; Manufacturer: Panasonic Electronic Components; Manufacturer Part Number: ERJ-3EKF1501V; Power (Watts): 0.1W, 1/10W; Temperature Coefficient: ±100ppm/°C; Power Rating: 100 mW; Voltage Rating: 75 V; Brand: Panasonic; Qualification: AEC-Q200; Supplier 1: Digi-Key; Supplier Part Number 1: P1.50KHCT-ND; RoHS: RoHS Compliant; Category: Resistors; Stock 1: 327505; Pricing 1: 1=0.1, 50=0.0114, 100=0.0084, 250=0.00644, 500=0.00514, 1000=0.00379 (USD); Packaging: Cut Tape (CT); Part Status: Active; Tolerance: ±1%; Composition: Thick Film; Features: Automotive AEC-Q200; Operating Temperature: -55°C ~ 155°C; Package: 0603 (1608 Metric); Supplier Device Package: 0603; Size / Dimension: 0.063" L x 0.031" W (1.60mm x 0.80mm); Height - Seated (Max): 0.022" (0.55mm); Number of Terminations: 2; Failure Rate: -; ComponentLink1URL: http://industrial.panasonic.com/www-cgi/jvcr13pz.cgi?E+PZ+3+AOA0002+ERJ3EKF1501V+7+WW; ComponentLink1Description: http://industrial.panasonic.com/www-cgi/jvcr13pz.cgi?E+PZ+3+AOA0002+ERJ3EKF1501V+7+WW; Supplier 2: Mouser; Supplier Part Number 2: 667-ERJ-3EKF1501V; Stock 2: 134982; Pricing 2: 1=0.150, 10=0.014, 100=0.006, 1000=0.004, 5000=0.002 (USD); Height: 0.45 mm; Length: 1.6 mm; Operating Temperature Range: - 55 C to + 155 C; Product: Thick Film Resistors SMD; Resistance: 1.5k; Termination Style: SMD/SMT; Type: Precision Thick Film Resistors SMD; Width: 0.8 mm; Case Code - in: 0603; Case Code - mm: 1608; Standard Pack Qty: 5000; RoHS - Mouser: E; Minimum Order Quantity: 1; Reeling: True; ComponentLink2URL: http://www.mouser.com/ds/2/315/AOA0000C86-911473.pdf; ComponentLink2Description: http://www.mouser.com/ds/2/315/AOA0000C86-911473.pdf
footprint R 0603 (Chip Resistor, 2-Leads, Body 1.6x0.8mm, IPC Medium Density)
pins: 1, 2

## ERJ-3EKF2700V
designator R?, comment 270
RES SMD 270 OHM 1% 1/10W 0603; Manufacturer: Panasonic Electronic Components; Manufacturer Part Number: ERJ-3EKF2700V; Power (Watts): 0.1W, 1/10W; Temperature Coefficient: ±100ppm/°C; Supplier 1: Digi-Key; Supplier Part Number 1: P270HCT-ND; RoHS: RoHS Compliant; Category: Resistors; Stock 1: 150401; Pricing 1: 1=0.1, 50=0.0114, 100=0.0084, 250=0.00644, 500=0.00514, 1000=0.00379 (USD); Packaging: Cut Tape (CT); Part Status: Active; Tolerance: ±1%; Composition: Thick Film; Features: Automotive AEC-Q200; Operating Temperature: -55°C ~ 155°C; Package: 0603 (1608 Metric); Supplier Device Package: 0603; Size / Dimension: 0.063" L x 0.031" W (1.60mm x 0.80mm); Height - Seated (Max): 0.022" (0.55mm); Number of Terminations: 2; Failure Rate: -; ComponentLink1URL: http://industrial.panasonic.com/www-cgi/jvcr13pz.cgi?E+PZ+3+AOA0002+ERJ3EKF2700V+7+WW; ComponentLink1Description: http://industrial.panasonic.com/www-cgi/jvcr13pz.cgi?E+PZ+3+AOA0002+ERJ3EKF2700V+7+WW; Supplier 2: Mouser; Supplier Part Number 2: 667-ERJ-3EKF2700V; Resistance: 270
footprint R 0603 (Chip Resistor, 2-Leads, Body 1.6x0.8mm, IPC Medium Density)
pins: 1, 2

## ERJ-3EKF2702V
designator R?, comment 27k
RES SMD 27K OHM 1% 1/10W 0603; Manufacturer: Panasonic Electronic Components; Manufacturer Part Number: ERJ-3EKF2702V; Power (Watts): 0.1W, 1/10W; Temperature Coefficient: ±100ppm/°C; Power Rating: 100 mW; Voltage Rating: 75 V; Brand: Panasonic; Qualification: AEC-Q200; Supplier 1: Digi-Key; Supplier Part Number 1: P27.0KHCT-ND; RoHS: RoHS Compliant; Category: Resistors; Stock 1: 117085; Pricing 1: 1=0.1, 50=0.0114, 100=0.0084, 250=0.00644, 500=0.00514, 1000=0.00379 (USD); Packaging: Cut Tape (CT); Part Status: Active; Tolerance: ±1%; Composition: Thick Film; Features: Automotive AEC-Q200; Operating Temperature: -55°C ~ 155°C; Package: 0603 (1608 Metric); Supplier Device Package: 0603; Size / Dimension: 0.063" L x 0.031" W (1.60mm x 0.80mm); Height - Seated (Max): 0.022" (0.55mm); Number of Terminations: 2; Failure Rate: -; ComponentLink1URL: http://industrial.panasonic.com/www-cgi/jvcr13pz.cgi?E+PZ+3+AOA0002+ERJ3EKF2702V+7+WW; ComponentLink1Description: http://industrial.panasonic.com/www-cgi/jvcr13pz.cgi?E+PZ+3+AOA0002+ERJ3EKF2702V+7+WW; Supplier 2: Mouser; Supplier Part Number 2: 667-ERJ-3EKF2702V; Stock 2: 59884; Pricing 2: 1=0.150, 10=0.014, 100=0.006, 1000=0.004, 5000=0.002 (USD); Height: 0.45 mm; Length: 1.6 mm; Operating Temperature Range: - 55 C to + 155 C; Product: Thick Film Resistors SMD; Resistance: 27k; Termination Style: SMD/SMT; Type: Precision Thick Film Resistors SMD; Width: 0.8 mm; Case Code - in: 0603; Case Code - mm: 1608; Standard Pack Qty: 5000; RoHS - Mouser: E; Minimum Order Quantity: 1; Reeling: True; ComponentLink2URL: http://www.mouser.com/ds/2/315/AOA0000C86-911473.pdf; ComponentLink2Description: http://www.mouser.com/ds/2/315/AOA0000C86-911473.pdf
footprint R 0603 (Chip Resistor, 2-Leads, Body 1.6x0.8mm, IPC Medium Density)
pins: 1, 2

## ERJ-3EKF3301V
designator R?, comment 3.3k
RES SMD 3.3K OHM 1% 1/10W 0603; Manufacturer: Panasonic Electronic Components; Manufacturer Part Number: ERJ-3EKF3301V; Power (Watts): 0.1W, 1/10W; Temperature Coefficient: ±100ppm/°C; Power Rating: 100 mW; Voltage Rating: 75 V; Brand: Panasonic; Qualification: AEC-Q200; Supplier 1: Digi-Key; Supplier Part Number 1: P3.30KHCT-ND; RoHS: RoHS Compliant; Category: Resistors; Stock 1: 395343; Pricing 1: 1=0.1, 50=0.0114, 100=0.0084, 250=0.00644, 500=0.00514, 1000=0.00379 (USD); Packaging: Cut Tape (CT); Part Status: Active; Tolerance: ±1%; Composition: Thick Film; Features: Automotive AEC-Q200; Operating Temperature: -55°C ~ 155°C; Package: 0603 (1608 Metric); Supplier Device Package: 0603; Size / Dimension: 0.063" L x 0.031" W (1.60mm x 0.80mm); Height - Seated (Max): 0.022" (0.55mm); Number of Terminations: 2; Failure Rate: -; ComponentLink1URL: http://industrial.panasonic.com/www-cgi/jvcr13pz.cgi?E+PZ+3+AOA0002+ERJ3EKF3301V+7+WW; ComponentLink1Description: http://industrial.panasonic.com/www-cgi/jvcr13pz.cgi?E+PZ+3+AOA0002+ERJ3EKF3301V+7+WW; Supplier 2: Mouser; Supplier Part Number 2: 667-ERJ-3EKF3301V; Stock 2: 83643; Pricing 2: 1=0.150, 10=0.014, 100=0.006, 1000=0.004, 5000=0.002 (USD); Height: 0.45 mm; Length: 1.6 mm; Operating Temperature Range: - 55 C to + 155 C; Product: Thick Film Resistors SMD; Resistance: 3.3k; Termination Style: SMD/SMT; Type: Precision Thick Film Resistors SMD; Width: 0.8 mm; Case Code - in: 0603; Case Code - mm: 1608; Standard Pack Qty: 5000; RoHS - Mouser: E; Minimum Order Quantity: 1; Reeling: True; ComponentLink2URL: http://www.mouser.com/ds/2/315/AOA0000C86-911473.pdf; ComponentLink2Description: http://www.mouser.com/ds/2/315/AOA0000C86-911473.pdf
footprint R 0603 (Chip Resistor, 2-Leads, Body 1.6x0.8mm, IPC Medium Density)
pins: 1, 2

## ERJ-3EKF3600V
designator R?, comment 360
RES SMD 360 OHM 1% 1/10W 0603; Manufacturer: Panasonic Electronic Components; Manufacturer Part Number: ERJ-3EKF3600V; Power (Watts): 0.1W, 1/10W; Temperature Coefficient: ±100ppm/°C; Supplier 1: Digi-Key; Supplier Part Number 1: P360HCT-ND; RoHS: RoHS Compliant; Category: Resistors; Stock 1: 101304; Pricing 1: 1=0.1, 50=0.0114, 100=0.0084, 250=0.00644, 500=0.00514, 1000=0.00379 (USD); Packaging: Cut Tape (CT); Part Status: Active; Tolerance: ±1%; Composition: Thick Film; Features: Automotive AEC-Q200; Operating Temperature: -55°C ~ 155°C; Package: 0603 (1608 Metric); Supplier Device Package: 0603; Size / Dimension: 0.063" L x 0.031" W (1.60mm x 0.80mm); Height - Seated (Max): 0.022" (0.55mm); Number of Terminations: 2; Failure Rate: -; ComponentLink1URL: http://industrial.panasonic.com/www-cgi/jvcr13pz.cgi?E+PZ+3+AOA0002+ERJ3EKF3600V+7+WW; ComponentLink1Description: http://industrial.panasonic.com/www-cgi/jvcr13pz.cgi?E+PZ+3+AOA0002+ERJ3EKF3600V+7+WW; Supplier 2: Mouser; Supplier Part Number 2: 667-ERJ-3EKF3600V; Resistance: 360
footprint R 0603 (Chip Resistor, 2-Leads, Body 1.6x0.8mm, IPC Medium Density)
pins: 1, 2

## ERJ-3EKF3902V
designator R?, comment 39k